# Altium footprint library rj.PcbLib: 13 footprints
Each footprint in its own frame and in the unit in brackets; x right, y up, seen from the top. Pads: shape width x height; smd on the part's side, far side on the other; paste and mask are expansions set on the pad; w line width, h text height; cw(c..) or ccw(c..) is an arc to the next point about the centre after c.
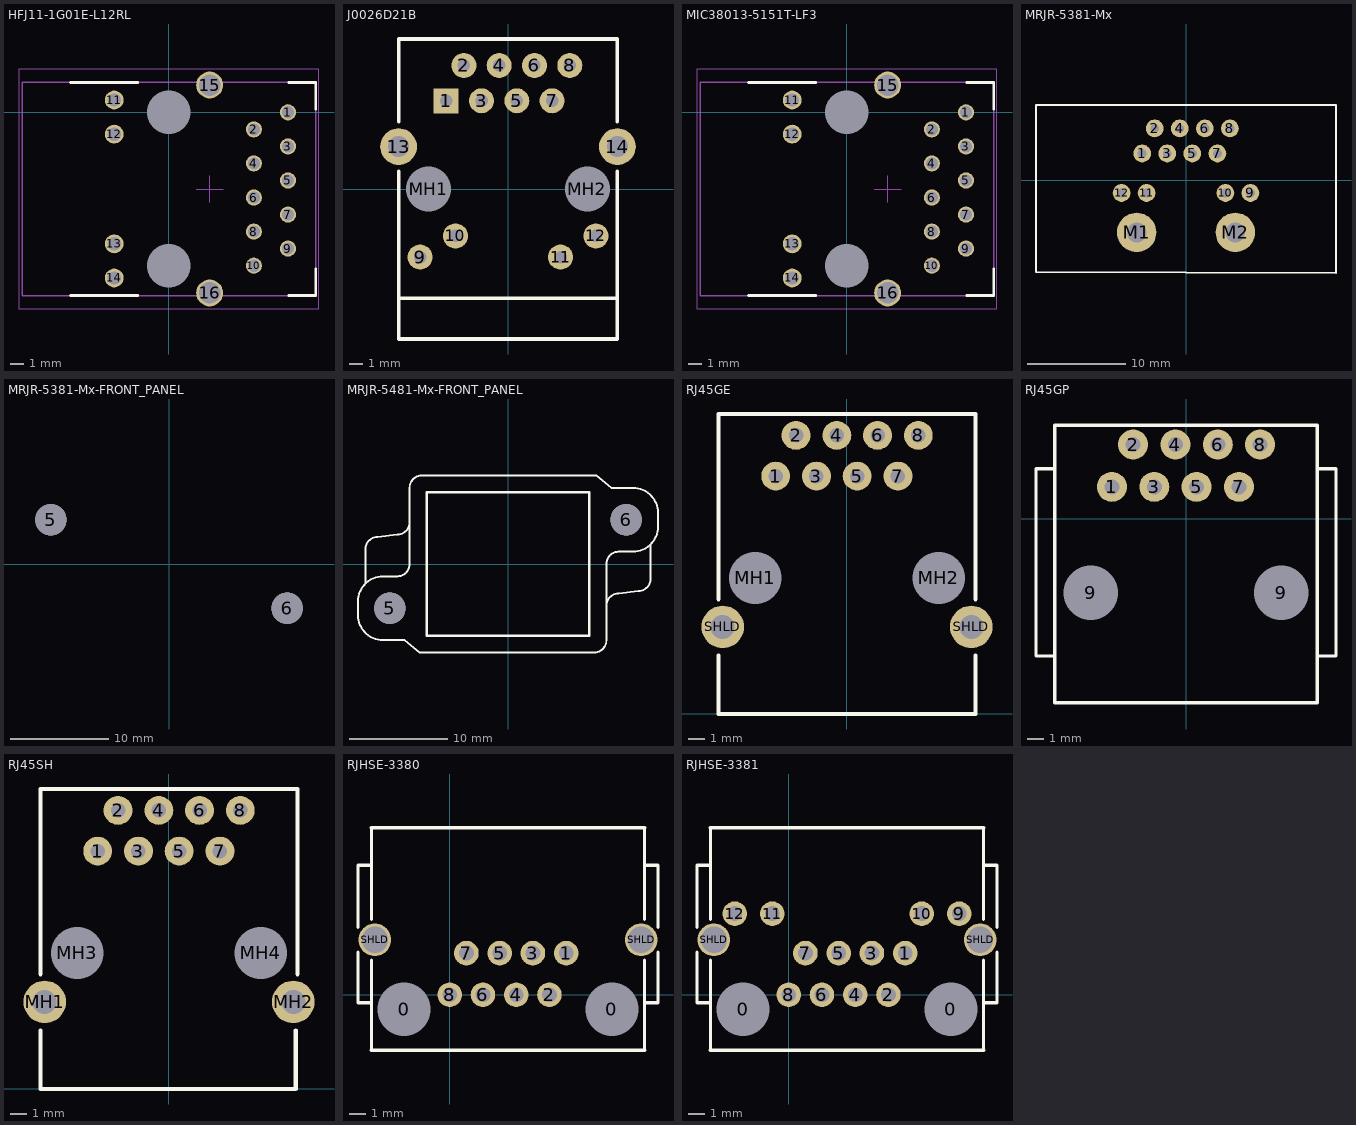
[diagram p0: the footprints below, top view; thin cyan lines are the x and y axes]

## HFJ11-1G01E-L12RL [mm] "HALO FastJack Integrated Gigabit RJ45 Transformer"
pads (18):
  round 1.2 hole 0.9: 1(8.89,0) 2(6.35,-1.27) 3(8.89,-2.54) 4(6.35,-3.81) 5(8.89,-5.08) 6(6.35,-6.35) 7(8.89,-7.62) 8(6.35,-8.89) 9(8.89,-10.16) 10(6.35,-11.43)
  round 1.4 hole 1: 11(-4.06,0.915) 12(-4.06,-1.625) 13(-4.06,-9.805) 14(-4.06,-12.345)
  round 2 hole 1.6: 15(3.05,2.03) 16(3.05,-13.46)
  round 0 hole 3.25 unplated: H1(0,0) H2(0,-11.43)
Top Overlay:
  lines w0.2: -7.31,-13.655 -2.31,-13.655 ; -7.31,2.225 -2.31,2.225 ; 8.95,-13.655 10.95,-13.655 10.95,-11.655 ; 8.95,2.225 10.95,2.225 10.95,0.225
Mechanical 13:
  lines w0.1: -10.89,-13.655 -10.89,2.225 10.95,2.225 10.95,-13.655 -10.89,-13.655
  text ".Designator" at -1.29,-5.585 h1
Mechanical 15:
  lines w0.05: -11.15,-14.665 -11.15,3.235 11.2,3.235 11.2,-14.665 ; -11.14,-14.64 11.2,-14.64 ; 2.05,-5.715 4.05,-5.715 ; 3.05,-6.715 3.05,-4.715
3D body "User Library-ARJ11B.step": height 13.86, standoff -3.28, extent -10.922,-13.845 10.668,2.415

## J0026D21B [mm] "10/100 Base-TX RJ45 1x1 Tab-DOWN with LEDs 8-pin (J0 series) integrated magnetics connector (ICM)"
height 14
pads (16):
  rect 1.8x1.8 hole 0.9: 1(-4.445,6.35)
  round 1.8 hole 0.9: 2(-3.175,8.89) 3(-1.905,6.35) 4(-0.635,8.89) 5(0.635,6.35) 6(1.905,8.89) 7(3.175,6.35) 8(4.445,8.89) 9(-6.325,-4.902) 10(-3.785,-3.378) 11(3.785,-4.902) 12(6.325,-3.378)
  round 2.65 hole 1.5: 13(-7.874,3.048) 14(7.874,3.048)
  round 2.95 hole 3.25 unplated: MH1(-5.715,0) MH2(5.715,0)
Top Overlay:
  lines w0.254: -7.874,-7.874 7.874,-7.874 ; -7.874,1.27 -7.874,-10.795 7.874,-10.795 7.874,1.27 ; -7.874,4.826 -7.874,10.795 7.874,10.795 7.874,4.826

## MIC38013-5151T-LF3 [mm] "Wurth Electronics Midcom Integrated Gigabit RJ45 Transformer"
pads (18):
  round 1.2 hole 0.9: 1(8.89,0) 2(6.35,-1.27) 3(8.89,-2.54) 4(6.35,-3.81) 5(8.89,-5.08) 6(6.35,-6.35) 7(8.89,-7.62) 8(6.35,-8.89) 9(8.89,-10.16) 10(6.35,-11.43)
  round 1.4 hole 1: 11(-4.06,0.915) 12(-4.06,-1.625) 13(-4.06,-9.805) 14(-4.06,-12.345)
  round 2 hole 1.6: 15(3.05,2.03) 16(3.05,-13.46)
  round 0 hole 3.25 unplated: H1(0,0) H2(0,-11.43)
Top Overlay:
  lines w0.2: -7.31,-13.655 -2.31,-13.655 ; -7.31,2.225 -2.31,2.225 ; 8.95,-13.655 10.95,-13.655 10.95,-11.655 ; 8.95,2.225 10.95,2.225 10.95,0.225
Mechanical 13:
  lines w0.1: -10.89,-13.655 10.95,-13.655 10.95,2.225 -10.89,2.225 -10.89,-13.655
  text ".Designator" at -1.29,-5.585 h1
Mechanical 15:
  lines w0.05: -11.15,-14.665 -11.15,3.235 11.2,3.235 11.2,-14.665 ; -11.14,-14.64 11.2,-14.64 ; 2.05,-5.715 4.05,-5.715 ; 3.05,-6.715 3.05,-4.715
3D body: height 13.74, standoff 0, extent -10.89,-13.655 10.95,2.225

## MRJR-5381-Mx [mm]
pads (14):
  round 1.8 hole 0.9: 1(-4.44,2.73) 2(-3.17,5.27) 3(-1.9,2.73) 4(-0.63,5.27) 5(0.64,2.73) 6(1.91,5.27) 7(3.18,2.73) 8(4.45,5.27) 9(6.53,-1.27) 10(3.99,-1.27) 11(-3.99,-1.27) 12(-6.53,-1.27)
  round 4 hole 2: M1(-5,-5.27) M2(5,-5.27)
Top Overlay:
  lines w0.2: -15.2,-9.27 -15.2,7.63 15.2,7.63 15.2,-9.37 -15.2,-9.27
3D body "M-MRJR-538X-01-REVT1.STEP": height 16.8, standoff -2.44, extent -15.15,-20.67 15.15,7.65

## MRJR-5381-Mx-FRONT_PANEL [mm]
pads (2):
  round 3.2 hole 3.2: 5(-12,4.5) 6(12,-4.5)
Bottom Overlay:
  lines w0.2: -14.5,2 -14.5,-1.5 ccw(c-13.25,-1.5) -13.25,-2.75 -11.25,-3 cw(c-11.25,-4.25) -10,-4.25 ; 14.5,-2 14.5,1.5 ccw(c13.25,1.5) 13.25,2.75 11.25,3 cw(c11.25,4.25) 10,4.25 ; -10,-4.25 -10,-7.75 ccw(c-8.75,-7.75) -8.75,-9 9,-9 10.5,-7.75 12.689,-7.75 ccw(c12.689,-5.189) 15.25,-5.189 15.25,-3.811 ccw(c12.689,-3.811) 12.689,-1.25 11.25,-1.25 cw(c11.25,0) 10,0 10,4.25 ; -10,-4.25 -10,0 ccw(c-11.25,0) -11.25,1.25 -12.689,1.25 cw(c-12.689,3.811) -15.25,3.811 -15.25,5.189 cw(c-12.689,5.189) -12.689,7.75 -10.5,7.75 -9,9 8.75,9 cw(c8.75,7.75) 10,7.75 10,4.25
  lines w0.254: -8.275,-7.275 -8.275,7.275 8.275,7.275 8.275,-7.275 -8.275,-7.275
3D body "M-MRJR-538X-01-REVT1.STEP": height 19.92, standoff -8.4, extent -15.15,-10.24 15.15,9

## MRJR-5481-Mx-FRONT_PANEL [mm]
pads (2):
  round 3.2 hole 3.2: 5(-12,-4.5) 6(12,4.5)
Top Overlay:
  lines w0.2: -14.5,-2 -14.5,1.5 cw(c-13.25,1.5) -13.25,2.75 -11.25,3 ccw(c-11.25,4.25) -10,4.25 ; 14.5,2 14.5,-1.5 cw(c13.25,-1.5) 13.25,-2.75 11.25,-3 ccw(c11.25,-4.25) 10,-4.25 ; -10,4.25 -10,0 cw(c-11.25,0) -11.25,-1.25 -12.689,-1.25 ccw(c-12.689,-3.811) -15.25,-3.811 -15.25,-5.189 ccw(c-12.689,-5.189) -12.689,-7.75 -10.5,-7.75 -9,-9 8.75,-9 ccw(c8.75,-7.75) 10,-7.75 10,-4.25 ; -10,4.25 -10,7.75 cw(c-8.75,7.75) -8.75,9 9,9 10.5,7.75 12.689,7.75 cw(c12.689,5.189) 15.25,5.189 15.25,3.811 cw(c12.689,3.811) 12.689,1.25 11.25,1.25 ccw(c11.25,0) 10,0 10,-4.25
  lines w0.254: -8.275,-7.275 8.275,-7.275 8.275,7.275 -8.275,7.275 -8.275,-7.275
3D body "M-MRJR-548X-0F-REVT2.STEP": height 22.56, standoff -8.4, extent -15.15,-9 15.15,9

## PCBComponent_1 [mm]
3D body "User Library-RJ45.step": height 16.51, standoff -10.49, extent -7.341,-12.938 11.659,2.262

## PCBComponent_1 - duplicate [mm]
3D body "User Library-WE-RJ45 LAN HPLE RJ45 LAN Transformer_799111614_WürthElektronik.step": height 16.51, standoff -16.51, extent -9.681,-5.778 10.189,13.122

## RJ45GE [mm]
pads (12):
  round 1.8 hole 0.9: 1(-4.445,14.829) 2(-3.175,17.369) 3(-1.905,14.829) 4(-0.635,17.369) 5(0.635,14.829) 6(1.905,17.369) 7(3.175,14.829) 8(4.445,17.369)
  round 2.95 hole 3.25: MH1(-5.715,8.479) MH2(5.715,8.479)
  round 2.65 hole 1.5: SHLD(-7.747,5.431) SHLD(7.747,5.431)
Top Overlay:
  lines w0.254: -8,3.654 -8,0 8,0 8,3.654 ; -8,7.154 -8,18.7 8,18.7 8,7.154
3D body: height 12.2, standoff 0, extent -8,0 8.002,18.7

## RJ45GP [mm] "TE CONNECTIVITY 520259-4"
height 16.5
pads (10):
  round 1.8 hole 0.9: 1(-4.445,1.905) 2(-3.175,4.445) 3(-1.905,1.905) 4(-0.635,4.445) 5(0.635,1.905) 6(1.905,4.445) 7(3.175,1.905) 8(4.445,4.445)
  round 1.8 hole 3.25: 9(-5.715,-4.445) 9(5.715,-4.445)
Top Overlay:
  lines w0.2: -7.9,-8.249 -9,-8.249 -9,3 -7.9,3 ; 7.899,-8.249 8.999,-8.249 8.999,3 7.899,3 ; -7.875,-11.049 -7.875,5.6 7.874,5.6 7.874,-11.049 -7.875,-11.049
3D body "c-5520259-04-a-3d.stp": height 16.4, standoff -3.41, extent -9.017,-10.955 9.017,5.555

## RJ45SH [mm]
pads (12):
  round 1.8 hole 0.9: 1(-4.445,14.829) 2(-3.175,17.369) 3(-1.905,14.829) 4(-0.635,17.369) 5(0.635,14.829) 6(1.905,17.369) 7(3.175,14.829) 8(4.445,17.369)
  round 2.65 hole 1.5: MH1(-7.747,5.431) MH2(7.747,5.431)
  round 2.95 hole 3.25: MH3(-5.715,8.479) MH4(5.715,8.479)
Top Overlay:
  lines w0.254: -8,3.654 -8,0 7.9,0 7.9,3.654 ; -8,7.154 -8,18.7 8,18.7 8,7.154

## RJHSE-3380 [mm] "Amphenol RJHSE-3380"
pads (12):
  round 3 hole 3.25: 0(-2.79,-0.89) 0(9.91,-0.89)
  round 1.5 hole 0.9: 1(7.11,2.54) 2(6.09,0) 3(5.08,2.54) 4(4.06,0) 5(3.05,2.54) 6(2.03,0) 7(1.02,2.54) 8(0,0)
  round 2 hole 1.6: SHLD(-4.57,3.35) SHLD(11.69,3.35)
Top Overlay:
  lines w0.2: -5.6,2.6 -5.6,-0.5 -4.78,-0.5 ; -5.6,4.1 -5.6,7.9 -4.78,7.9 ; -4.78,2.1 -4.78,-3.4 -4.8,-3.4 11.92,-3.4 11.9,-3.4 11.9,2.1 ; -4.78,4.6 -4.78,10.2 -4.8,10.2 11.92,10.2 11.9,10.2 11.9,4.6 ; 11.9,-0.5 12.72,-0.5 12.72,2.6 ; 11.9,7.9 12.72,7.9 12.72,4.1
3D body "M-RJHSE-3380-REVT2.STEP": height 15.74, standoff -3.69, extent -5.594,-3.529 12.694,10.034

## RJHSE-3381 [mm] "Amphenol RJHSE-3381"
pads (16):
  round 3 hole 3.25: 0(-2.79,-0.89) 0(9.91,-0.89)
  round 1.5 hole 0.9: 1(7.11,2.54) 2(6.09,0) 3(5.08,2.54) 4(4.06,0) 5(3.05,2.54) 6(2.03,0) 7(1.02,2.54) 8(0,0) 9(10.41,4.95) 10(8.12,4.95) 11(-1,4.95) 12(-3.29,4.95)
  round 2 hole 1.6: SHLD(-4.57,3.35) SHLD(11.69,3.35)
Top Overlay:
  lines w0.2: -5.6,2.6 -5.6,-0.5 -4.78,-0.5 ; -5.6,4.1 -5.6,7.9 -4.78,7.9 ; -4.78,2.1 -4.78,-3.4 -4.8,-3.4 11.92,-3.4 11.9,-3.4 11.9,2.1 ; -4.78,4.6 -4.78,10.2 -4.8,10.2 11.92,10.2 11.9,10.2 11.9,4.6 ; 11.9,-0.5 12.72,-0.5 12.72,2.6 ; 11.9,7.9 12.72,7.9 12.72,4.1
3D body "Amphenol M-RJHSE-338X-REVT3.STEP": height 16.37, standoff -3.69, extent -5.59,-3.397 12.698,10.167